# Altium schematic symbol library jlcpcb_2025_04_capacitors_extended_0805.schlib: 3281 symbols (part 7 of 18) (continued)
## CC0805CRNPO9BN3R3
designator C?  Capacitance: 3.3pF  (hidden comment: *)
Capacitor, Ceramic (MLCC), 3.3pF, 50V, NP0, SMD 0805; Manufacturer: YAGEO; Manufacturer Part Number: CC0805CRNPO9BN3R3; Package Size: 0805; JLCPCB Basic Part: No; JLCPCB Part Number: C327234; Supplier 1: LCSC; Category: Capacitors - MLCC; Supplier Part Number 1: C327234; Voltage Rating: 50V; Temperature Coefficient: NP0; RoHS: Yes; ComponentLink1Description: Datasheet; ComponentLink1URL: https://wmsc.lcsc.com/wmsc/upload/file/pdf/v2/lcsc/1811141242_YAGEO-CC0805CRNPO9BN3R3_C327234.pdf; ComponentLink2Description: JLCPCB Part URL; ComponentLink2URL: https://jlcpcb.com/partdetail/C327234; ComponentLink3Description: LCSC Part URL; ComponentLink3URL: https://lcsc.com/product-detail/Multilayer-Ceramic-Capacitors-MLCC---SMD-SMT_YAGEO-YAGEO-CC0805CRNPO9BN3R3_C327234.html
footprint CAP-0805 (0805 (2012M) Capacitor)
pins: 1, 2

## CC0805CRNPO9BN3R6
designator C?  Capacitance: 3.6pF  (hidden comment: *)
Capacitor, Ceramic (MLCC), 3.6pF, 50V, NP0, SMD 0805; Manufacturer: YAGEO; Manufacturer Part Number: CC0805CRNPO9BN3R6; Package Size: 0805; JLCPCB Basic Part: No; JLCPCB Part Number: C519952; Supplier 1: LCSC; Category: Capacitors - MLCC; Supplier Part Number 1: C519952; Voltage Rating: 50V; Temperature Coefficient: NP0; RoHS: Yes; ComponentLink1Description: Datasheet; ComponentLink1URL: https://wmsc.lcsc.com/wmsc/upload/file/pdf/v2/lcsc/2007231534_YAGEO-CC0805CRNPO9BN3R6_C519952.pdf; ComponentLink2Description: JLCPCB Part URL; ComponentLink2URL: https://jlcpcb.com/partdetail/C519952; ComponentLink3Description: LCSC Part URL; ComponentLink3URL: https://lcsc.com/product-detail/Multilayer-Ceramic-Capacitors-MLCC---SMD-SMT_YAGEO-YAGEO-CC0805CRNPO9BN3R6_C519952.html
footprint CAP-0805 (0805 (2012M) Capacitor)
pins: 1, 2

## CC0805CRNPO9BN3R9
designator C?  Capacitance: 3.9pF  (hidden comment: *)
Capacitor, Ceramic (MLCC), 3.9pF, 50V, NP0, SMD 0805; Manufacturer: YAGEO; Manufacturer Part Number: CC0805CRNPO9BN3R9; Package Size: 0805; JLCPCB Basic Part: No; JLCPCB Part Number: C519938; Supplier 1: LCSC; Category: Capacitors - MLCC; Supplier Part Number 1: C519938; Voltage Rating: 50V; Temperature Coefficient: NP0; RoHS: Yes; ComponentLink1Description: Datasheet; ComponentLink1URL: https://wmsc.lcsc.com/wmsc/upload/file/pdf/v2/lcsc/2008031233_YAGEO-CC0805CRNPO9BN3R9_C519938.pdf; ComponentLink2Description: JLCPCB Part URL; ComponentLink2URL: https://jlcpcb.com/partdetail/C519938; ComponentLink3Description: LCSC Part URL; ComponentLink3URL: https://lcsc.com/product-detail/Multilayer-Ceramic-Capacitors-MLCC---SMD-SMT_YAGEO-YAGEO-CC0805CRNPO9BN3R9_C519938.html
footprint CAP-0805 (0805 (2012M) Capacitor)
pins: 1, 2

## CC0805CRNPO9BN4R0
designator C?  Capacitance: 4pF  (hidden comment: *)
Capacitor, Ceramic (MLCC), 4pF, 50V, NP0, SMD 0805; Manufacturer: YAGEO; Manufacturer Part Number: CC0805CRNPO9BN4R0; Package Size: 0805; JLCPCB Basic Part: No; JLCPCB Part Number: C519939; Supplier 1: LCSC; Category: Capacitors - MLCC; Supplier Part Number 1: C519939; Voltage Rating: 50V; Temperature Coefficient: NP0; RoHS: Yes; ComponentLink1Description: Datasheet; ComponentLink1URL: https://wmsc.lcsc.com/wmsc/upload/file/pdf/v2/lcsc/2005141203_YAGEO-CC0805CRNPO9BN4R0_C519939.pdf; ComponentLink2Description: JLCPCB Part URL; ComponentLink2URL: https://jlcpcb.com/partdetail/C519939; ComponentLink3Description: LCSC Part URL; ComponentLink3URL: https://lcsc.com/product-detail/Multilayer-Ceramic-Capacitors-MLCC---SMD-SMT_YAGEO-YAGEO-CC0805CRNPO9BN4R0_C519939.html
footprint CAP-0805 (0805 (2012M) Capacitor)
pins: 1, 2

## CC0805CRNPO9BN4R7
designator C?  Capacitance: 4.7pF  (hidden comment: *)
Capacitor, Ceramic (MLCC), 4.7pF, 50V, NP0, SMD 0805; Manufacturer: YAGEO; Manufacturer Part Number: CC0805CRNPO9BN4R7; Package Size: 0805; JLCPCB Basic Part: No; JLCPCB Part Number: C327159; Supplier 1: LCSC; Category: Capacitors - MLCC; Supplier Part Number 1: C327159; Voltage Rating: 50V; Temperature Coefficient: NP0; RoHS: Yes; ComponentLink1Description: Datasheet; ComponentLink1URL: https://wmsc.lcsc.com/wmsc/upload/file/pdf/v2/lcsc/1811141224_YAGEO-CC0805CRNPO9BN4R7_C327159.pdf; ComponentLink2Description: JLCPCB Part URL; ComponentLink2URL: https://jlcpcb.com/partdetail/C327159; ComponentLink3Description: LCSC Part URL; ComponentLink3URL: https://lcsc.com/product-detail/Multilayer-Ceramic-Capacitors-MLCC---SMD-SMT_YAGEO-YAGEO-CC0805CRNPO9BN4R7_C327159.html
footprint CAP-0805 (0805 (2012M) Capacitor)
pins: 1, 2

## CC0805CRNPO9BN5R0
designator C?  Capacitance: 5pF  (hidden comment: *)
Capacitor, Ceramic (MLCC), 5pF, 50V, NP0, SMD 0805; Manufacturer: YAGEO; Manufacturer Part Number: CC0805CRNPO9BN5R0; Package Size: 0805; JLCPCB Basic Part: No; JLCPCB Part Number: C519940; Supplier 1: LCSC; Category: Capacitors - MLCC; Supplier Part Number 1: C519940; Voltage Rating: 50V; Temperature Coefficient: NP0; RoHS: Yes; ComponentLink1Description: Datasheet; ComponentLink1URL: https://wmsc.lcsc.com/wmsc/upload/file/pdf/v2/lcsc/2007161234_YAGEO-CC0805CRNPO9BN5R0_C519940.pdf; ComponentLink2Description: JLCPCB Part URL; ComponentLink2URL: https://jlcpcb.com/partdetail/C519940; ComponentLink3Description: LCSC Part URL; ComponentLink3URL: https://lcsc.com/product-detail/Multilayer-Ceramic-Capacitors-MLCC---SMD-SMT_YAGEO-YAGEO-CC0805CRNPO9BN5R0_C519940.html
footprint CAP-0805 (0805 (2012M) Capacitor)
pins: 1, 2

## CC0805CRNPO9BN5R1
designator C?  Capacitance: 5.1pF  (hidden comment: *)
Capacitor, Ceramic (MLCC), 5.1pF, 50V, NP0, SMD 0805; Manufacturer: YAGEO; Manufacturer Part Number: CC0805CRNPO9BN5R1; Package Size: 0805; JLCPCB Basic Part: No; JLCPCB Part Number: C519941; Supplier 1: LCSC; Category: Capacitors - MLCC; Supplier Part Number 1: C519941; Voltage Rating: 50V; Temperature Coefficient: NP0; RoHS: Yes; ComponentLink1Description: Datasheet; ComponentLink1URL: https://wmsc.lcsc.com/wmsc/upload/file/pdf/v2/lcsc/2008051835_YAGEO-CC0805CRNPO9BN5R1_C519941.pdf; ComponentLink2Description: JLCPCB Part URL; ComponentLink2URL: https://jlcpcb.com/partdetail/C519941; ComponentLink3Description: LCSC Part URL; ComponentLink3URL: https://lcsc.com/product-detail/Multilayer-Ceramic-Capacitors-MLCC---SMD-SMT_YAGEO-YAGEO-CC0805CRNPO9BN5R1_C519941.html
footprint CAP-0805 (0805 (2012M) Capacitor)
pins: 1, 2

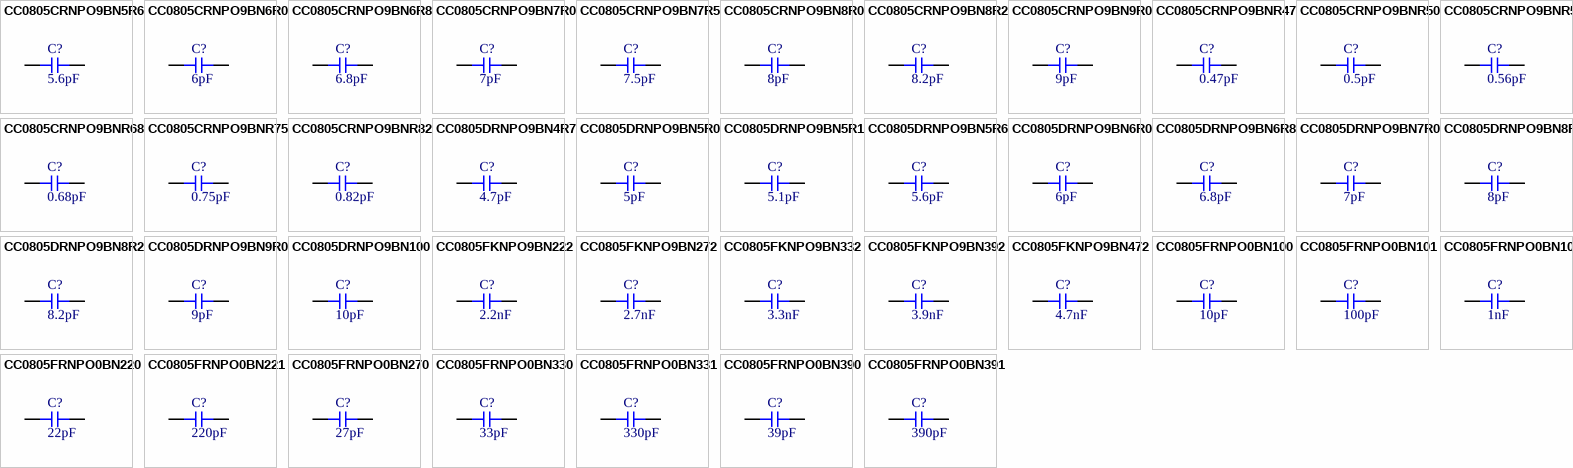
[diagram p31: symbols CC0805CRNPO9BN5R6 to CC0805FRNPO0BN391]

## CC0805CRNPO9BN5R6
designator C?  Capacitance: 5.6pF  (hidden comment: *)
Capacitor, Ceramic (MLCC), 5.6pF, 50V, NP0, SMD 0805; Manufacturer: YAGEO; Manufacturer Part Number: CC0805CRNPO9BN5R6; Package Size: 0805; JLCPCB Basic Part: No; JLCPCB Part Number: C513555; Supplier 1: LCSC; Category: Capacitors - MLCC; Supplier Part Number 1: C513555; Voltage Rating: 50V; Temperature Coefficient: NP0; RoHS: Yes; ComponentLink1Description: Datasheet; ComponentLink1URL: https://wmsc.lcsc.com/wmsc/upload/file/pdf/v2/lcsc/2004231432_YAGEO-CC0805CRNPO9BN5R6_C513555.pdf; ComponentLink2Description: JLCPCB Part URL; ComponentLink2URL: https://jlcpcb.com/partdetail/C513555; ComponentLink3Description: LCSC Part URL; ComponentLink3URL: https://lcsc.com/product-detail/Multilayer-Ceramic-Capacitors-MLCC---SMD-SMT_YAGEO-YAGEO-CC0805CRNPO9BN5R6_C513555.html
footprint CAP-0805 (0805 (2012M) Capacitor)
pins: 1, 2

## CC0805CRNPO9BN6R0
designator C?  Capacitance: 6pF  (hidden comment: *)
Capacitor, Ceramic (MLCC), 6pF, 50V, NP0, SMD 0805; Manufacturer: YAGEO; Manufacturer Part Number: CC0805CRNPO9BN6R0; Package Size: 0805; JLCPCB Basic Part: No; JLCPCB Part Number: C136031; Supplier 1: LCSC; Category: Capacitors - MLCC; Supplier Part Number 1: C136031; Voltage Rating: 50V; Temperature Coefficient: NP0; RoHS: Yes; ComponentLink1Description: Datasheet; ComponentLink1URL: https://wmsc.lcsc.com/wmsc/upload/file/pdf/v2/lcsc/2006151108_YAGEO-CC0805CRNPO9BN6R0_C136031.pdf; ComponentLink2Description: JLCPCB Part URL; ComponentLink2URL: https://jlcpcb.com/partdetail/C136031; ComponentLink3Description: LCSC Part URL; ComponentLink3URL: https://lcsc.com/product-detail/Multilayer-Ceramic-Capacitors-MLCC---SMD-SMT_YAGEO-YAGEO-CC0805CRNPO9BN6R0_C136031.html
footprint CAP-0805 (0805 (2012M) Capacitor)
pins: 1, 2

## CC0805CRNPO9BN6R8
designator C?  Capacitance: 6.8pF  (hidden comment: *)
Capacitor, Ceramic (MLCC), 6.8pF, 50V, NP0, SMD 0805; Manufacturer: YAGEO; Manufacturer Part Number: CC0805CRNPO9BN6R8; Package Size: 0805; JLCPCB Basic Part: No; JLCPCB Part Number: C519942; Supplier 1: LCSC; Category: Capacitors - MLCC; Supplier Part Number 1: C519942; Voltage Rating: 50V; Temperature Coefficient: NP0; RoHS: Yes; ComponentLink1Description: Datasheet; ComponentLink1URL: https://wmsc.lcsc.com/wmsc/upload/file/pdf/v2/lcsc/2007101233_YAGEO-CC0805CRNPO9BN6R8_C519942.pdf; ComponentLink2Description: JLCPCB Part URL; ComponentLink2URL: https://jlcpcb.com/partdetail/C519942; ComponentLink3Description: LCSC Part URL; ComponentLink3URL: https://lcsc.com/product-detail/Multilayer-Ceramic-Capacitors-MLCC---SMD-SMT_YAGEO-YAGEO-CC0805CRNPO9BN6R8_C519942.html
footprint CAP-0805 (0805 (2012M) Capacitor)
pins: 1, 2

## CC0805CRNPO9BN7R0
designator C?  Capacitance: 7pF  (hidden comment: *)
Capacitor, Ceramic (MLCC), 7pF, 50V, NP0, SMD 0805; Manufacturer: YAGEO; Manufacturer Part Number: CC0805CRNPO9BN7R0; Package Size: 0805; JLCPCB Basic Part: No; JLCPCB Part Number: C309481; Supplier 1: LCSC; Category: Capacitors - MLCC; Supplier Part Number 1: C309481; Voltage Rating: 50V; Temperature Coefficient: NP0; RoHS: Yes; ComponentLink1Description: Datasheet; ComponentLink1URL: https://wmsc.lcsc.com/wmsc/upload/file/pdf/v2/lcsc/2304140030_YAGEO-CC0805CRNPO9BN7R0_C309481.pdf; ComponentLink2Description: JLCPCB Part URL; ComponentLink2URL: https://jlcpcb.com/partdetail/C309481; ComponentLink3Description: LCSC Part URL; ComponentLink3URL: https://lcsc.com/product-detail/Multilayer-Ceramic-Capacitors-MLCC---SMD-SMT_YAGEO-YAGEO-CC0805CRNPO9BN7R0_C309481.html
footprint CAP-0805 (0805 (2012M) Capacitor)
pins: 1, 2

## CC0805CRNPO9BN7R5
designator C?  Capacitance: 7.5pF  (hidden comment: *)
Capacitor, Ceramic (MLCC), 7.5pF, 50V, NP0, SMD 0805; Manufacturer: YAGEO; Manufacturer Part Number: CC0805CRNPO9BN7R5; Package Size: 0805; JLCPCB Basic Part: No; JLCPCB Part Number: C519943; Supplier 1: LCSC; Category: Capacitors - MLCC; Supplier Part Number 1: C519943; Voltage Rating: 50V; Temperature Coefficient: NP0; RoHS: Yes; ComponentLink1Description: Datasheet; ComponentLink1URL: https://wmsc.lcsc.com/wmsc/upload/file/pdf/v2/lcsc/2007161234_YAGEO-CC0805CRNPO9BN7R5_C519943.pdf; ComponentLink2Description: JLCPCB Part URL; ComponentLink2URL: https://jlcpcb.com/partdetail/C519943; ComponentLink3Description: LCSC Part URL; ComponentLink3URL: https://lcsc.com/product-detail/Multilayer-Ceramic-Capacitors-MLCC---SMD-SMT_YAGEO-YAGEO-CC0805CRNPO9BN7R5_C519943.html
footprint CAP-0805 (0805 (2012M) Capacitor)
pins: 1, 2

## CC0805CRNPO9BN8R0
designator C?  Capacitance: 8pF  (hidden comment: *)
Capacitor, Ceramic (MLCC), 8pF, 50V, SMD 0805; Manufacturer: YAGEO; Manufacturer Part Number: CC0805CRNPO9BN8R0; Package Size: 0805; JLCPCB Basic Part: No; JLCPCB Part Number: C519944; Supplier 1: LCSC; Category: Capacitors - MLCC; Supplier Part Number 1: C519944; Voltage Rating: 50V; RoHS: Yes; ComponentLink1Description: Datasheet; ComponentLink1URL: https://wmsc.lcsc.com/wmsc/upload/file/pdf/v2/lcsc/2007161234_YAGEO-CC0805CRNPO9BN8R0_C519944.pdf; ComponentLink2Description: JLCPCB Part URL; ComponentLink2URL: https://jlcpcb.com/partdetail/C519944; ComponentLink3Description: LCSC Part URL; ComponentLink3URL: https://lcsc.com/product-detail/Multilayer-Ceramic-Capacitors-MLCC---SMD-SMT_YAGEO-YAGEO-CC0805CRNPO9BN8R0_C519944.html
footprint CAP-0805 (0805 (2012M) Capacitor)
pins: 1, 2

## CC0805CRNPO9BN8R2
designator C?  Capacitance: 8.2pF  (hidden comment: *)
Capacitor, Ceramic (MLCC), 8.2pF, 50V, NP0, SMD 0805; Manufacturer: YAGEO; Manufacturer Part Number: CC0805CRNPO9BN8R2; Package Size: 0805; JLCPCB Basic Part: No; JLCPCB Part Number: C326837; Supplier 1: LCSC; Category: Capacitors - MLCC; Supplier Part Number 1: C326837; Voltage Rating: 50V; Temperature Coefficient: NP0; RoHS: Yes; ComponentLink1Description: Datasheet; ComponentLink1URL: https://wmsc.lcsc.com/wmsc/upload/file/pdf/v2/lcsc/1811141224_YAGEO-CC0805CRNPO9BN8R2_C326837.pdf; ComponentLink2Description: JLCPCB Part URL; ComponentLink2URL: https://jlcpcb.com/partdetail/C326837; ComponentLink3Description: LCSC Part URL; ComponentLink3URL: https://lcsc.com/product-detail/Multilayer-Ceramic-Capacitors-MLCC---SMD-SMT_YAGEO-YAGEO-CC0805CRNPO9BN8R2_C326837.html
footprint CAP-0805 (0805 (2012M) Capacitor)
pins: 1, 2

## CC0805CRNPO9BN9R0
designator C?  Capacitance: 9pF  (hidden comment: *)
Capacitor, Ceramic (MLCC), 9pF, 50V, NP0, SMD 0805; Manufacturer: YAGEO; Manufacturer Part Number: CC0805CRNPO9BN9R0; Package Size: 0805; JLCPCB Basic Part: No; JLCPCB Part Number: C519945; Supplier 1: LCSC; Category: Capacitors - MLCC; Supplier Part Number 1: C519945; Voltage Rating: 50V; Temperature Coefficient: NP0; RoHS: Yes; ComponentLink1Description: Datasheet; ComponentLink1URL: https://wmsc.lcsc.com/wmsc/upload/file/pdf/v2/lcsc/2006011835_YAGEO-CC0805CRNPO9BN9R0_C519945.pdf; ComponentLink2Description: JLCPCB Part URL; ComponentLink2URL: https://jlcpcb.com/partdetail/C519945; ComponentLink3Description: LCSC Part URL; ComponentLink3URL: https://lcsc.com/product-detail/Multilayer-Ceramic-Capacitors-MLCC---SMD-SMT_YAGEO-YAGEO-CC0805CRNPO9BN9R0_C519945.html
footprint CAP-0805 (0805 (2012M) Capacitor)
pins: 1, 2

## CC0805CRNPO9BNR47
designator C?  Capacitance: 0.47pF  (hidden comment: *)
Capacitor, Ceramic (MLCC), 0.47pF, 50V, NP0, SMD 0805; Manufacturer: YAGEO; Manufacturer Part Number: CC0805CRNPO9BNR47; Package Size: 0805; JLCPCB Basic Part: No; JLCPCB Part Number: C519946; Supplier 1: LCSC; Category: Capacitors - MLCC; Supplier Part Number 1: C519946; Voltage Rating: 50V; Temperature Coefficient: NP0; RoHS: Yes; ComponentLink1Description: Datasheet; ComponentLink1URL: https://wmsc.lcsc.com/wmsc/upload/file/pdf/v2/lcsc/2006011835_YAGEO-CC0805CRNPO9BNR47_C519946.pdf; ComponentLink2Description: JLCPCB Part URL; ComponentLink2URL: https://jlcpcb.com/partdetail/C519946; ComponentLink3Description: LCSC Part URL; ComponentLink3URL: https://lcsc.com/product-detail/Multilayer-Ceramic-Capacitors-MLCC---SMD-SMT_YAGEO-YAGEO-CC0805CRNPO9BNR47_C519946.html
footprint CAP-0805 (0805 (2012M) Capacitor)
pins: 1, 2

## CC0805CRNPO9BNR50
designator C?  Capacitance: 0.5pF  (hidden comment: *)
Capacitor, Ceramic (MLCC), 0.5pF, 50V, NP0, SMD 0805; Manufacturer: YAGEO; Manufacturer Part Number: CC0805CRNPO9BNR50; Package Size: 0805; JLCPCB Basic Part: No; JLCPCB Part Number: C519947; Supplier 1: LCSC; Category: Capacitors - MLCC; Supplier Part Number 1: C519947; Voltage Rating: 50V; Temperature Coefficient: NP0; RoHS: Yes; ComponentLink1Description: Datasheet; ComponentLink1URL: https://wmsc.lcsc.com/wmsc/upload/file/pdf/v2/lcsc/2005141203_YAGEO-CC0805CRNPO9BNR50_C519947.pdf; ComponentLink2Description: JLCPCB Part URL; ComponentLink2URL: https://jlcpcb.com/partdetail/C519947; ComponentLink3Description: LCSC Part URL; ComponentLink3URL: https://lcsc.com/product-detail/Multilayer-Ceramic-Capacitors-MLCC---SMD-SMT_YAGEO-YAGEO-CC0805CRNPO9BNR50_C519947.html
footprint CAP-0805 (0805 (2012M) Capacitor)
pins: 1, 2

## CC0805CRNPO9BNR56
designator C?  Capacitance: 0.56pF  (hidden comment: *)
Capacitor, Ceramic (MLCC), 0.56pF, 50V, NP0, SMD 0805; Manufacturer: YAGEO; Manufacturer Part Number: CC0805CRNPO9BNR56; Package Size: 0805; JLCPCB Basic Part: No; JLCPCB Part Number: C519948; Supplier 1: LCSC; Category: Capacitors - MLCC; Supplier Part Number 1: C519948; Voltage Rating: 50V; Temperature Coefficient: NP0; RoHS: Yes; ComponentLink1Description: Datasheet; ComponentLink1URL: https://wmsc.lcsc.com/wmsc/upload/file/pdf/v2/lcsc/2007231534_YAGEO-CC0805CRNPO9BNR56_C519948.pdf; ComponentLink2Description: JLCPCB Part URL; ComponentLink2URL: https://jlcpcb.com/partdetail/C519948; ComponentLink3Description: LCSC Part URL; ComponentLink3URL: https://lcsc.com/product-detail/Multilayer-Ceramic-Capacitors-MLCC---SMD-SMT_YAGEO-YAGEO-CC0805CRNPO9BNR56_C519948.html
footprint CAP-0805 (0805 (2012M) Capacitor)
pins: 1, 2

## CC0805CRNPO9BNR68
designator C?  Capacitance: 0.68pF  (hidden comment: *)
Capacitor, Ceramic (MLCC), 0.68pF, 50V, NP0, SMD 0805; Manufacturer: YAGEO; Manufacturer Part Number: CC0805CRNPO9BNR68; Package Size: 0805; JLCPCB Basic Part: No; JLCPCB Part Number: C519949; Supplier 1: LCSC; Category: Capacitors - MLCC; Supplier Part Number 1: C519949; Voltage Rating: 50V; Temperature Coefficient: NP0; RoHS: Yes; ComponentLink1Description: Datasheet; ComponentLink1URL: https://wmsc.lcsc.com/wmsc/upload/file/pdf/v2/lcsc/2007161234_YAGEO-CC0805CRNPO9BNR68_C519949.pdf; ComponentLink2Description: JLCPCB Part URL; ComponentLink2URL: https://jlcpcb.com/partdetail/C519949; ComponentLink3Description: LCSC Part URL; ComponentLink3URL: https://lcsc.com/product-detail/Multilayer-Ceramic-Capacitors-MLCC---SMD-SMT_YAGEO-YAGEO-CC0805CRNPO9BNR68_C519949.html
footprint CAP-0805 (0805 (2012M) Capacitor)
pins: 1, 2

## CC0805CRNPO9BNR75
designator C?  Capacitance: 0.75pF  (hidden comment: *)
Capacitor, Ceramic (MLCC), 0.75pF, 50V, NP0, SMD 0805; Manufacturer: YAGEO; Manufacturer Part Number: CC0805CRNPO9BNR75; Package Size: 0805; JLCPCB Basic Part: No; JLCPCB Part Number: C519950; Supplier 1: LCSC; Category: Capacitors - MLCC; Supplier Part Number 1: C519950; Voltage Rating: 50V; Temperature Coefficient: NP0; RoHS: Yes; ComponentLink1Description: Datasheet; ComponentLink1URL: https://wmsc.lcsc.com/wmsc/upload/file/pdf/v2/lcsc/2007161234_YAGEO-CC0805CRNPO9BNR75_C519950.pdf; ComponentLink2Description: JLCPCB Part URL; ComponentLink2URL: https://jlcpcb.com/partdetail/C519950; ComponentLink3Description: LCSC Part URL; ComponentLink3URL: https://lcsc.com/product-detail/Multilayer-Ceramic-Capacitors-MLCC---SMD-SMT_YAGEO-YAGEO-CC0805CRNPO9BNR75_C519950.html
footprint CAP-0805 (0805 (2012M) Capacitor)
pins: 1, 2

## CC0805CRNPO9BNR82
designator C?  Capacitance: 0.82pF  (hidden comment: *)
Capacitor, Ceramic (MLCC), 0.82pF, 50V, NP0, SMD 0805; Manufacturer: YAGEO; Manufacturer Part Number: CC0805CRNPO9BNR82; Package Size: 0805; JLCPCB Basic Part: No; JLCPCB Part Number: C519951; Supplier 1: LCSC; Category: Capacitors - MLCC; Supplier Part Number 1: C519951; Voltage Rating: 50V; Temperature Coefficient: NP0; RoHS: Yes; ComponentLink1Description: Datasheet; ComponentLink1URL: https://wmsc.lcsc.com/wmsc/upload/file/pdf/v2/lcsc/2008051835_YAGEO-CC0805CRNPO9BNR82_C519951.pdf; ComponentLink2Description: JLCPCB Part URL; ComponentLink2URL: https://jlcpcb.com/partdetail/C519951; ComponentLink3Description: LCSC Part URL; ComponentLink3URL: https://lcsc.com/product-detail/Multilayer-Ceramic-Capacitors-MLCC---SMD-SMT_YAGEO-YAGEO-CC0805CRNPO9BNR82_C519951.html
footprint CAP-0805 (0805 (2012M) Capacitor)
pins: 1, 2

## CC0805DRNPO9BN4R7
designator C?  Capacitance: 4.7pF  (hidden comment: *)
Capacitor, Ceramic (MLCC), 4.7pF, 50V, NP0, SMD 0805; Manufacturer: YAGEO; Manufacturer Part Number: CC0805DRNPO9BN4R7; Package Size: 0805; JLCPCB Basic Part: No; JLCPCB Part Number: C2181061; Supplier 1: LCSC; Category: Capacitors - MLCC; Supplier Part Number 1: C2181061; Voltage Rating: 50V; Temperature Coefficient: NP0; RoHS: Yes; ComponentLink1Description: Datasheet; ComponentLink1URL: https://wmsc.lcsc.com/wmsc/upload/file/pdf/v2/lcsc/2202041200_YAGEO-CC0805DRNPO9BN4R7_C2181061.pdf; ComponentLink2Description: JLCPCB Part URL; ComponentLink2URL: https://jlcpcb.com/partdetail/C2181061; ComponentLink3Description: LCSC Part URL; ComponentLink3URL: https://lcsc.com/product-detail/Multilayer-Ceramic-Capacitors-MLCC---SMD-SMT_YAGEO-YAGEO-CC0805DRNPO9BN4R7_C2181061.html
footprint CAP-0805 (0805 (2012M) Capacitor)
pins: 1, 2

## CC0805DRNPO9BN5R0
designator C?  Capacitance: 5pF  (hidden comment: *)
Capacitor, Ceramic (MLCC), 5pF, 50V, NP0, SMD 0805; Manufacturer: YAGEO; Manufacturer Part Number: CC0805DRNPO9BN5R0; Package Size: 0805; JLCPCB Basic Part: No; JLCPCB Part Number: C513573; Supplier 1: LCSC; Category: Capacitors - MLCC; Supplier Part Number 1: C513573; Voltage Rating: 50V; Temperature Coefficient: NP0; RoHS: Yes; ComponentLink1Description: Datasheet; ComponentLink1URL: https://wmsc.lcsc.com/wmsc/upload/file/pdf/v2/lcsc/2004231432_YAGEO-CC0805DRNPO9BN5R0_C513573.pdf; ComponentLink2Description: JLCPCB Part URL; ComponentLink2URL: https://jlcpcb.com/partdetail/C513573; ComponentLink3Description: LCSC Part URL; ComponentLink3URL: https://lcsc.com/product-detail/Multilayer-Ceramic-Capacitors-MLCC---SMD-SMT_YAGEO-YAGEO-CC0805DRNPO9BN5R0_C513573.html
footprint CAP-0805 (0805 (2012M) Capacitor)
pins: 1, 2

## CC0805DRNPO9BN5R1
designator C?  Capacitance: 5.1pF  (hidden comment: *)
Capacitor, Ceramic (MLCC), 5.1pF, 50V, NP0, SMD 0805; Manufacturer: YAGEO; Manufacturer Part Number: CC0805DRNPO9BN5R1; Package Size: 0805; JLCPCB Basic Part: No; JLCPCB Part Number: C519955; Supplier 1: LCSC; Category: Capacitors - MLCC; Supplier Part Number 1: C519955; Voltage Rating: 50V; Temperature Coefficient: NP0; RoHS: Yes; ComponentLink1Description: Datasheet; ComponentLink1URL: https://wmsc.lcsc.com/wmsc/upload/file/pdf/v2/lcsc/2008051835_YAGEO-CC0805DRNPO9BN5R1_C519955.pdf; ComponentLink2Description: JLCPCB Part URL; ComponentLink2URL: https://jlcpcb.com/partdetail/C519955; ComponentLink3Description: LCSC Part URL; ComponentLink3URL: https://lcsc.com/product-detail/Multilayer-Ceramic-Capacitors-MLCC---SMD-SMT_YAGEO-YAGEO-CC0805DRNPO9BN5R1_C519955.html
footprint CAP-0805 (0805 (2012M) Capacitor)
pins: 1, 2

## CC0805DRNPO9BN5R6
designator C?  Capacitance: 5.6pF  (hidden comment: *)
Capacitor, Ceramic (MLCC), 5.6pF, 50V, NP0, SMD 0805; Manufacturer: YAGEO; Manufacturer Part Number: CC0805DRNPO9BN5R6; Package Size: 0805; JLCPCB Basic Part: No; JLCPCB Part Number: C519956; Supplier 1: LCSC; Category: Capacitors - MLCC; Supplier Part Number 1: C519956; Voltage Rating: 50V; Temperature Coefficient: NP0; RoHS: Yes; ComponentLink1Description: Datasheet; ComponentLink1URL: https://wmsc.lcsc.com/wmsc/upload/file/pdf/v2/lcsc/2006011835_YAGEO-CC0805DRNPO9BN5R6_C519956.pdf; ComponentLink2Description: JLCPCB Part URL; ComponentLink2URL: https://jlcpcb.com/partdetail/C519956; ComponentLink3Description: LCSC Part URL; ComponentLink3URL: https://lcsc.com/product-detail/Multilayer-Ceramic-Capacitors-MLCC---SMD-SMT_YAGEO-YAGEO-CC0805DRNPO9BN5R6_C519956.html
footprint CAP-0805 (0805 (2012M) Capacitor)
pins: 1, 2

## CC0805DRNPO9BN6R0
designator C?  Capacitance: 6pF  (hidden comment: *)
Capacitor, Ceramic (MLCC), 6pF, 50V, NP0, SMD 0805; Manufacturer: YAGEO; Manufacturer Part Number: CC0805DRNPO9BN6R0; Package Size: 0805; JLCPCB Basic Part: No; JLCPCB Part Number: C519957; Supplier 1: LCSC; Category: Capacitors - MLCC; Supplier Part Number 1: C519957; Voltage Rating: 50V; Temperature Coefficient: NP0; RoHS: Yes; ComponentLink1Description: Datasheet; ComponentLink1URL: https://wmsc.lcsc.com/wmsc/upload/file/pdf/v2/lcsc/2007231534_YAGEO-CC0805DRNPO9BN6R0_C519957.pdf; ComponentLink2Description: JLCPCB Part URL; ComponentLink2URL: https://jlcpcb.com/partdetail/C519957; ComponentLink3Description: LCSC Part URL; ComponentLink3URL: https://lcsc.com/product-detail/Multilayer-Ceramic-Capacitors-MLCC---SMD-SMT_YAGEO-YAGEO-CC0805DRNPO9BN6R0_C519957.html
footprint CAP-0805 (0805 (2012M) Capacitor)
pins: 1, 2

## CC0805DRNPO9BN6R8
designator C?  Capacitance: 6.8pF  (hidden comment: *)
Capacitor, Ceramic (MLCC), 6.8pF, 50V, NP0, SMD 0805; Manufacturer: YAGEO; Manufacturer Part Number: CC0805DRNPO9BN6R8; Package Size: 0805; JLCPCB Basic Part: No; JLCPCB Part Number: C327201; Supplier 1: LCSC; Category: Capacitors - MLCC; Supplier Part Number 1: C327201; Voltage Rating: 50V; Temperature Coefficient: NP0; RoHS: Yes; ComponentLink1Description: Datasheet; ComponentLink1URL: https://wmsc.lcsc.com/wmsc/upload/file/pdf/v2/lcsc/1811141225_YAGEO-CC0805DRNPO9BN6R8_C327201.pdf; ComponentLink2Description: JLCPCB Part URL; ComponentLink2URL: https://jlcpcb.com/partdetail/C327201; ComponentLink3Description: LCSC Part URL; ComponentLink3URL: https://lcsc.com/product-detail/Multilayer-Ceramic-Capacitors-MLCC---SMD-SMT_YAGEO-YAGEO-CC0805DRNPO9BN6R8_C327201.html
footprint CAP-0805 (0805 (2012M) Capacitor)
pins: 1, 2

## CC0805DRNPO9BN7R0
designator C?  Capacitance: 7pF  (hidden comment: *)
Capacitor, Ceramic (MLCC), 7pF, 50V, NP0, SMD 0805; Manufacturer: YAGEO; Manufacturer Part Number: CC0805DRNPO9BN7R0; Package Size: 0805; JLCPCB Basic Part: No; JLCPCB Part Number: C519958; Supplier 1: LCSC; Category: Capacitors - MLCC; Supplier Part Number 1: C519958; Voltage Rating: 50V; Temperature Coefficient: NP0; RoHS: Yes; ComponentLink1Description: Datasheet; ComponentLink1URL: https://wmsc.lcsc.com/wmsc/upload/file/pdf/v2/lcsc/2006011835_YAGEO-CC0805DRNPO9BN7R0_C519958.pdf; ComponentLink2Description: JLCPCB Part URL; ComponentLink2URL: https://jlcpcb.com/partdetail/C519958; ComponentLink3Description: LCSC Part URL; ComponentLink3URL: https://lcsc.com/product-detail/Multilayer-Ceramic-Capacitors-MLCC---SMD-SMT_YAGEO-YAGEO-CC0805DRNPO9BN7R0_C519958.html
footprint CAP-0805 (0805 (2012M) Capacitor)
pins: 1, 2

## CC0805DRNPO9BN8R0
designator C?  Capacitance: 8pF  (hidden comment: *)
Capacitor, Ceramic (MLCC), 8pF, 50V, NP0, SMD 0805; Manufacturer: YAGEO; Manufacturer Part Number: CC0805DRNPO9BN8R0; Package Size: 0805; JLCPCB Basic Part: No; JLCPCB Part Number: C519959; Supplier 1: LCSC; Category: Capacitors - MLCC; Supplier Part Number 1: C519959; Voltage Rating: 50V; Temperature Coefficient: NP0; RoHS: Yes; ComponentLink1Description: Datasheet; ComponentLink1URL: https://wmsc.lcsc.com/wmsc/upload/file/pdf/v2/lcsc/2005181835_YAGEO-CC0805DRNPO9BN8R0_C519959.pdf; ComponentLink2Description: JLCPCB Part URL; ComponentLink2URL: https://jlcpcb.com/partdetail/C519959; ComponentLink3Description: LCSC Part URL; ComponentLink3URL: https://lcsc.com/product-detail/Multilayer-Ceramic-Capacitors-MLCC---SMD-SMT_YAGEO-YAGEO-CC0805DRNPO9BN8R0_C519959.html
footprint CAP-0805 (0805 (2012M) Capacitor)
pins: 1, 2

## CC0805DRNPO9BN8R2
designator C?  Capacitance: 8.2pF  (hidden comment: *)
Capacitor, Ceramic (MLCC), 8.2pF, 50V, NP0, SMD 0805; Manufacturer: YAGEO; Manufacturer Part Number: CC0805DRNPO9BN8R2; Package Size: 0805; JLCPCB Basic Part: No; JLCPCB Part Number: C327233; Supplier 1: LCSC; Category: Capacitors - MLCC; Supplier Part Number 1: C327233; Voltage Rating: 50V; Temperature Coefficient: NP0; RoHS: Yes; ComponentLink1Description: Datasheet; ComponentLink1URL: https://wmsc.lcsc.com/wmsc/upload/file/pdf/v2/lcsc/1811141233_YAGEO-CC0805DRNPO9BN8R2_C327233.pdf; ComponentLink2Description: JLCPCB Part URL; ComponentLink2URL: https://jlcpcb.com/partdetail/C327233; ComponentLink3Description: LCSC Part URL; ComponentLink3URL: https://lcsc.com/product-detail/Multilayer-Ceramic-Capacitors-MLCC---SMD-SMT_YAGEO-YAGEO-CC0805DRNPO9BN8R2_C327233.html
footprint CAP-0805 (0805 (2012M) Capacitor)
pins: 1, 2

## CC0805DRNPO9BN9R0
designator C?  Capacitance: 9pF  (hidden comment: *)
Capacitor, Ceramic (MLCC), 9pF, 50V, NP0, SMD 0805; Manufacturer: YAGEO; Manufacturer Part Number: CC0805DRNPO9BN9R0; Package Size: 0805; JLCPCB Basic Part: No; JLCPCB Part Number: C519960; Supplier 1: LCSC; Category: Capacitors - MLCC; Supplier Part Number 1: C519960; Voltage Rating: 50V; Temperature Coefficient: NP0; RoHS: Yes; ComponentLink1Description: Datasheet; ComponentLink1URL: https://wmsc.lcsc.com/wmsc/upload/file/pdf/v2/lcsc/2007161235_YAGEO-CC0805DRNPO9BN9R0_C519960.pdf; ComponentLink2Description: JLCPCB Part URL; ComponentLink2URL: https://jlcpcb.com/partdetail/C519960; ComponentLink3Description: LCSC Part URL; ComponentLink3URL: https://lcsc.com/product-detail/Multilayer-Ceramic-Capacitors-MLCC---SMD-SMT_YAGEO-YAGEO-CC0805DRNPO9BN9R0_C519960.html
footprint CAP-0805 (0805 (2012M) Capacitor)
pins: 1, 2

## CC0805DRNPO9BN100
designator C?  Capacitance: 10pF  (hidden comment: *)
Capacitor, Ceramic (MLCC), 10pF, 50V, NP0, SMD 0805; Manufacturer: YAGEO; Manufacturer Part Number: CC0805DRNPO9BN100; Package Size: 0805; JLCPCB Basic Part: No; JLCPCB Part Number: C519954; Supplier 1: LCSC; Category: Capacitors - MLCC; Supplier Part Number 1: C519954; Voltage Rating: 50V; Temperature Coefficient: NP0; RoHS: Yes; ComponentLink1Description: Datasheet; ComponentLink1URL: https://wmsc.lcsc.com/wmsc/upload/file/pdf/v2/lcsc/2006011835_YAGEO-CC0805DRNPO9BN100_C519954.pdf; ComponentLink2Description: JLCPCB Part URL; ComponentLink2URL: https://jlcpcb.com/partdetail/C519954; ComponentLink3Description: LCSC Part URL; ComponentLink3URL: https://lcsc.com/product-detail/Multilayer-Ceramic-Capacitors-MLCC---SMD-SMT_YAGEO-YAGEO-CC0805DRNPO9BN100_C519954.html
footprint CAP-0805 (0805 (2012M) Capacitor)
pins: 1, 2

## CC0805FKNPO9BN222
designator C?  Capacitance: 2.2nF  (hidden comment: *)
Capacitor, Ceramic (MLCC), 2.2nF, ±1%, 50V, NP0, ±1%, SMD 0805; Manufacturer: YAGEO; Manufacturer Part Number: CC0805FKNPO9BN222; Package Size: 0805; JLCPCB Basic Part: No; JLCPCB Part Number: C541569; Supplier 1: LCSC; Category: Capacitors - MLCC; Supplier Part Number 1: C541569; Tolerance: ±1%; Voltage Rating: 50V; Temperature Coefficient: NP0; RoHS: Yes; ComponentLink1Description: Datasheet; ComponentLink1URL: https://wmsc.lcsc.com/wmsc/upload/file/pdf/v2/lcsc/2006151213_YAGEO-CC0805FKNPO9BN222_C541569.pdf; ComponentLink2Description: JLCPCB Part URL; ComponentLink2URL: https://jlcpcb.com/partdetail/C541569; ComponentLink3Description: LCSC Part URL; ComponentLink3URL: https://lcsc.com/product-detail/Multilayer-Ceramic-Capacitors-MLCC---SMD-SMT_YAGEO-YAGEO-CC0805FKNPO9BN222_C541569.html
footprint CAP-0805 (0805 (2012M) Capacitor)
pins: 1, 2

## CC0805FKNPO9BN272
designator C?  Capacitance: 2.7nF  (hidden comment: *)
Capacitor, Ceramic (MLCC), 2.7nF, 50V, NP0, SMD 0805; Manufacturer: YAGEO; Manufacturer Part Number: CC0805FKNPO9BN272; Package Size: 0805; JLCPCB Basic Part: No; JLCPCB Part Number: C541570; Supplier 1: LCSC; Category: Capacitors - MLCC; Supplier Part Number 1: C541570; Voltage Rating: 50V; Temperature Coefficient: NP0; RoHS: Yes; ComponentLink1Description: Datasheet; ComponentLink1URL: https://wmsc.lcsc.com/wmsc/upload/file/pdf/v2/lcsc/2006151213_YAGEO-CC0805FKNPO9BN272_C541570.pdf; ComponentLink2Description: JLCPCB Part URL; ComponentLink2URL: https://jlcpcb.com/partdetail/C541570; ComponentLink3Description: LCSC Part URL; ComponentLink3URL: https://lcsc.com/product-detail/Multilayer-Ceramic-Capacitors-MLCC---SMD-SMT_YAGEO-YAGEO-CC0805FKNPO9BN272_C541570.html
footprint CAP-0805 (0805 (2012M) Capacitor)
pins: 1, 2

## CC0805FKNPO9BN332
designator C?  Capacitance: 3.3nF  (hidden comment: *)
Capacitor, Ceramic (MLCC), 3.3nF, 50V, NP0, SMD 0805; Manufacturer: YAGEO; Manufacturer Part Number: CC0805FKNPO9BN332; Package Size: 0805; JLCPCB Basic Part: No; JLCPCB Part Number: C541575; Supplier 1: LCSC; Category: Capacitors - MLCC; Supplier Part Number 1: C541575; Voltage Rating: 50V; Temperature Coefficient: NP0; RoHS: Yes; ComponentLink1Description: Datasheet; ComponentLink1URL: https://wmsc.lcsc.com/wmsc/upload/file/pdf/v2/lcsc/2006151213_YAGEO-CC0805FKNPO9BN332_C541575.pdf; ComponentLink2Description: JLCPCB Part URL; ComponentLink2URL: https://jlcpcb.com/partdetail/C541575; ComponentLink3Description: LCSC Part URL; ComponentLink3URL: https://lcsc.com/product-detail/Multilayer-Ceramic-Capacitors-MLCC---SMD-SMT_YAGEO-YAGEO-CC0805FKNPO9BN332_C541575.html
footprint CAP-0805 (0805 (2012M) Capacitor)
pins: 1, 2

## CC0805FKNPO9BN392
designator C?  Capacitance: 3.9nF  (hidden comment: *)
Capacitor, Ceramic (MLCC), 3.9nF, ±1%, 50V, NP0, ±1%, SMD 0805; Manufacturer: YAGEO; Manufacturer Part Number: CC0805FKNPO9BN392; Package Size: 0805; JLCPCB Basic Part: No; JLCPCB Part Number: C541576; Supplier 1: LCSC; Category: Capacitors - MLCC; Supplier Part Number 1: C541576; Tolerance: ±1%; Voltage Rating: 50V; Temperature Coefficient: NP0; RoHS: Yes; ComponentLink1Description: Datasheet; ComponentLink1URL: https://wmsc.lcsc.com/wmsc/upload/file/pdf/v2/lcsc/2006151213_YAGEO-CC0805FKNPO9BN392_C541576.pdf; ComponentLink2Description: JLCPCB Part URL; ComponentLink2URL: https://jlcpcb.com/partdetail/C541576; ComponentLink3Description: LCSC Part URL; ComponentLink3URL: https://lcsc.com/product-detail/Multilayer-Ceramic-Capacitors-MLCC---SMD-SMT_YAGEO-YAGEO-CC0805FKNPO9BN392_C541576.html
footprint CAP-0805 (0805 (2012M) Capacitor)
pins: 1, 2

## CC0805FKNPO9BN472
designator C?  Capacitance: 4.7nF  (hidden comment: *)
Capacitor, Ceramic (MLCC), 4.7nF, 50V, NP0, SMD 0805; Manufacturer: YAGEO; Manufacturer Part Number: CC0805FKNPO9BN472; Package Size: 0805; JLCPCB Basic Part: No; JLCPCB Part Number: C541577; Supplier 1: LCSC; Category: Capacitors - MLCC; Supplier Part Number 1: C541577; Voltage Rating: 50V; Temperature Coefficient: NP0; RoHS: Yes; ComponentLink1Description: Datasheet; ComponentLink1URL: https://wmsc.lcsc.com/wmsc/upload/file/pdf/v2/lcsc/2006151213_YAGEO-CC0805FKNPO9BN472_C541577.pdf; ComponentLink2Description: JLCPCB Part URL; ComponentLink2URL: https://jlcpcb.com/partdetail/C541577; ComponentLink3Description: LCSC Part URL; ComponentLink3URL: https://lcsc.com/product-detail/Multilayer-Ceramic-Capacitors-MLCC---SMD-SMT_YAGEO-YAGEO-CC0805FKNPO9BN472_C541577.html
footprint CAP-0805 (0805 (2012M) Capacitor)
pins: 1, 2

## CC0805FRNPO0BN100
designator C?  Capacitance: 10pF  (hidden comment: *)
Capacitor, Ceramic (MLCC), 10pF, ±1%, 100V, ±1%, SMD 0805; Manufacturer: YAGEO; Manufacturer Part Number: CC0805FRNPO0BN100; Package Size: 0805; JLCPCB Basic Part: No; JLCPCB Part Number: C576885; Supplier 1: LCSC; Category: Capacitors - MLCC; Supplier Part Number 1: C576885; Tolerance: ±1%; Voltage Rating: 100V; RoHS: Yes; ComponentLink1Description: Datasheet; ComponentLink1URL: https://wmsc.lcsc.com/wmsc/upload/file/pdf/v2/lcsc/2306061129_YAGEO-CC0805FRNPO0BN100_C576885.pdf; ComponentLink2Description: JLCPCB Part URL; ComponentLink2URL: https://jlcpcb.com/partdetail/C576885; ComponentLink3Description: LCSC Part URL; ComponentLink3URL: https://lcsc.com/product-detail/Multilayer-Ceramic-Capacitors-MLCC---SMD-SMT_YAGEO-YAGEO-CC0805FRNPO0BN100_C576885.html
footprint CAP-0805 (0805 (2012M) Capacitor)
pins: 1, 2

## CC0805FRNPO0BN101
designator C?  Capacitance: 100pF  (hidden comment: *)
Capacitor, Ceramic (MLCC), 100pF, ±1%, 100V, NP0, ±1%, SMD 0805; Manufacturer: YAGEO; Manufacturer Part Number: CC0805FRNPO0BN101; Package Size: 0805; JLCPCB Basic Part: No; JLCPCB Part Number: C1853576; Supplier 1: LCSC; Category: Capacitors - MLCC; Supplier Part Number 1: C1853576; Tolerance: ±1%; Voltage Rating: 100V; Temperature Coefficient: NP0; RoHS: Yes; ComponentLink1Description: Datasheet; ComponentLink1URL: https://wmsc.lcsc.com/wmsc/upload/file/pdf/v2/lcsc/2201271100_YAGEO-CC0805FRNPO0BN101_C1853576.pdf; ComponentLink2Description: JLCPCB Part URL; ComponentLink2URL: https://jlcpcb.com/partdetail/C1853576; ComponentLink3Description: LCSC Part URL; ComponentLink3URL: https://lcsc.com/product-detail/Multilayer-Ceramic-Capacitors-MLCC---SMD-SMT_YAGEO-YAGEO-CC0805FRNPO0BN101_C1853576.html
footprint CAP-0805 (0805 (2012M) Capacitor)
pins: 1, 2

## CC0805FRNPO0BN102
designator C?  Capacitance: 1nF  (hidden comment: *)
Capacitor, Ceramic (MLCC), 1nF, ±1%, 100V, NP0, ±1%, SMD 0805; Manufacturer: YAGEO; Manufacturer Part Number: CC0805FRNPO0BN102; Package Size: 0805; JLCPCB Basic Part: No; JLCPCB Part Number: C576886; Supplier 1: LCSC; Category: Capacitors - MLCC; Supplier Part Number 1: C576886; Tolerance: ±1%; Voltage Rating: 100V; Temperature Coefficient: NP0; RoHS: Yes; ComponentLink1Description: Datasheet; ComponentLink1URL: https://wmsc.lcsc.com/wmsc/upload/file/pdf/v2/lcsc/2304140030_YAGEO-CC0805FRNPO0BN102_C576886.pdf; ComponentLink2Description: JLCPCB Part URL; ComponentLink2URL: https://jlcpcb.com/partdetail/C576886; ComponentLink3Description: LCSC Part URL; ComponentLink3URL: https://lcsc.com/product-detail/Multilayer-Ceramic-Capacitors-MLCC---SMD-SMT_YAGEO-YAGEO-CC0805FRNPO0BN102_C576886.html
footprint CAP-0805 (0805 (2012M) Capacitor)
pins: 1, 2

## CC0805FRNPO0BN220
designator C?  Capacitance: 22pF  (hidden comment: *)
Capacitor, Ceramic (MLCC), 22pF, ±1%, 100V, NP0, ±1%, SMD 0805; Manufacturer: YAGEO; Manufacturer Part Number: CC0805FRNPO0BN220; Package Size: 0805; JLCPCB Basic Part: No; JLCPCB Part Number: C576893; Supplier 1: LCSC; Category: Capacitors - MLCC; Supplier Part Number 1: C576893; Tolerance: ±1%; Voltage Rating: 100V; Temperature Coefficient: NP0; RoHS: Yes; ComponentLink1Description: Datasheet; ComponentLink1URL: https://wmsc.lcsc.com/wmsc/upload/file/pdf/v2/lcsc/2311211121_YAGEO-CC0805FRNPO0BN220_C576893.pdf; ComponentLink2Description: JLCPCB Part URL; ComponentLink2URL: https://jlcpcb.com/partdetail/C576893; ComponentLink3Description: LCSC Part URL; ComponentLink3URL: https://lcsc.com/product-detail/Multilayer-Ceramic-Capacitors-MLCC---SMD-SMT_YAGEO-YAGEO-CC0805FRNPO0BN220_C576893.html
footprint CAP-0805 (0805 (2012M) Capacitor)
pins: 1, 2

## CC0805FRNPO0BN221
designator C?  Capacitance: 220pF  (hidden comment: *)
Capacitor, Ceramic (MLCC), 220pF, ±1%, 100V, NP0, ±1%, SMD 0805; Manufacturer: YAGEO; Manufacturer Part Number: CC0805FRNPO0BN221; Package Size: 0805; JLCPCB Basic Part: No; JLCPCB Part Number: C576894; Supplier 1: LCSC; Category: Capacitors - MLCC; Supplier Part Number 1: C576894; Tolerance: ±1%; Voltage Rating: 100V; Temperature Coefficient: NP0; RoHS: Yes; ComponentLink1Description: Datasheet; ComponentLink1URL: https://wmsc.lcsc.com/wmsc/upload/file/pdf/v2/lcsc/2212091030_YAGEO-CC0805FRNPO0BN221_C576894.pdf; ComponentLink2Description: JLCPCB Part URL; ComponentLink2URL: https://jlcpcb.com/partdetail/C576894; ComponentLink3Description: LCSC Part URL; ComponentLink3URL: https://lcsc.com/product-detail/Multilayer-Ceramic-Capacitors-MLCC---SMD-SMT_YAGEO-YAGEO-CC0805FRNPO0BN221_C576894.html
footprint CAP-0805 (0805 (2012M) Capacitor)
pins: 1, 2

## CC0805FRNPO0BN270
designator C?  Capacitance: 27pF  (hidden comment: *)
Capacitor, Ceramic (MLCC), 27pF, ±1%, 100V, NP0, ±1%, SMD 0805; Manufacturer: YAGEO; Manufacturer Part Number: CC0805FRNPO0BN270; Package Size: 0805; JLCPCB Basic Part: No; JLCPCB Part Number: C576895; Supplier 1: LCSC; Category: Capacitors - MLCC; Supplier Part Number 1: C576895; Tolerance: ±1%; Voltage Rating: 100V; Temperature Coefficient: NP0; RoHS: Yes; ComponentLink1Description: Datasheet; ComponentLink1URL: https://wmsc.lcsc.com/wmsc/upload/file/pdf/v2/lcsc/2212091030_YAGEO-CC0805FRNPO0BN270_C576895.pdf; ComponentLink2Description: JLCPCB Part URL; ComponentLink2URL: https://jlcpcb.com/partdetail/C576895; ComponentLink3Description: LCSC Part URL; ComponentLink3URL: https://lcsc.com/product-detail/Multilayer-Ceramic-Capacitors-MLCC---SMD-SMT_YAGEO-YAGEO-CC0805FRNPO0BN270_C576895.html
footprint CAP-0805 (0805 (2012M) Capacitor)
pins: 1, 2

## CC0805FRNPO0BN330
designator C?  Capacitance: 33pF  (hidden comment: *)
Capacitor, Ceramic (MLCC), 33pF, ±1%, 100V, NP0, ±1%, SMD 0805; Manufacturer: YAGEO; Manufacturer Part Number: CC0805FRNPO0BN330; Package Size: 0805; JLCPCB Basic Part: No; JLCPCB Part Number: C576896; Supplier 1: LCSC; Category: Capacitors - MLCC; Supplier Part Number 1: C576896; Tolerance: ±1%; Voltage Rating: 100V; Temperature Coefficient: NP0; RoHS: Yes; ComponentLink1Description: Datasheet; ComponentLink1URL: https://wmsc.lcsc.com/wmsc/upload/file/pdf/v2/lcsc/2212091030_YAGEO-CC0805FRNPO0BN330_C576896.pdf; ComponentLink2Description: JLCPCB Part URL; ComponentLink2URL: https://jlcpcb.com/partdetail/C576896; ComponentLink3Description: LCSC Part URL; ComponentLink3URL: https://lcsc.com/product-detail/Multilayer-Ceramic-Capacitors-MLCC---SMD-SMT_YAGEO-YAGEO-CC0805FRNPO0BN330_C576896.html
footprint CAP-0805 (0805 (2012M) Capacitor)
pins: 1, 2

## CC0805FRNPO0BN331
designator C?  Capacitance: 330pF  (hidden comment: *)
Capacitor, Ceramic (MLCC), 330pF, ±1%, 100V, NP0, ±1%, SMD 0805; Manufacturer: YAGEO; Manufacturer Part Number: CC0805FRNPO0BN331; Package Size: 0805; JLCPCB Basic Part: No; JLCPCB Part Number: C527075; Supplier 1: LCSC; Category: Capacitors - MLCC; Supplier Part Number 1: C527075; Tolerance: ±1%; Voltage Rating: 100V; Temperature Coefficient: NP0; RoHS: Yes; ComponentLink1Description: Datasheet; ComponentLink1URL: https://wmsc.lcsc.com/wmsc/upload/file/pdf/v2/lcsc/2005261832_YAGEO-CC0805FRNPO0BN331_C527075.pdf; ComponentLink2Description: JLCPCB Part URL; ComponentLink2URL: https://jlcpcb.com/partdetail/C527075; ComponentLink3Description: LCSC Part URL; ComponentLink3URL: https://lcsc.com/product-detail/Multilayer-Ceramic-Capacitors-MLCC---SMD-SMT_YAGEO-YAGEO-CC0805FRNPO0BN331_C527075.html
footprint CAP-0805 (0805 (2012M) Capacitor)
pins: 1, 2

## CC0805FRNPO0BN390
designator C?  Capacitance: 39pF  (hidden comment: *)
Capacitor, Ceramic (MLCC), 39pF, ±1%, 100V, NP0, ±1%, SMD 0805; Manufacturer: YAGEO; Manufacturer Part Number: CC0805FRNPO0BN390; Package Size: 0805; JLCPCB Basic Part: No; JLCPCB Part Number: C576897; Supplier 1: LCSC; Category: Capacitors - MLCC; Supplier Part Number 1: C576897; Tolerance: ±1%; Voltage Rating: 100V; Temperature Coefficient: NP0; RoHS: Yes; ComponentLink1Description: Datasheet; ComponentLink1URL: https://wmsc.lcsc.com/wmsc/upload/file/pdf/v2/lcsc/2212091030_YAGEO-CC0805FRNPO0BN390_C576897.pdf; ComponentLink2Description: JLCPCB Part URL; ComponentLink2URL: https://jlcpcb.com/partdetail/C576897; ComponentLink3Description: LCSC Part URL; ComponentLink3URL: https://lcsc.com/product-detail/Multilayer-Ceramic-Capacitors-MLCC---SMD-SMT_YAGEO-YAGEO-CC0805FRNPO0BN390_C576897.html
footprint CAP-0805 (0805 (2012M) Capacitor)
pins: 1, 2

## CC0805FRNPO0BN391
designator C?  Capacitance: 390pF  (hidden comment: *)
Capacitor, Ceramic (MLCC), 390pF, ±1%, 100V, NP0, ±1%, SMD 0805; Manufacturer: YAGEO; Manufacturer Part Number: CC0805FRNPO0BN391; Package Size: 0805; JLCPCB Basic Part: No; JLCPCB Part Number: C576898; Supplier 1: LCSC; Category: Capacitors - MLCC; Supplier Part Number 1: C576898; Tolerance: ±1%; Voltage Rating: 100V; Temperature Coefficient: NP0; RoHS: Yes; ComponentLink1Description: Datasheet; ComponentLink1URL: https://wmsc.lcsc.com/wmsc/upload/file/pdf/v2/lcsc/2211161830_YAGEO-CC0805FRNPO0BN391_C576898.pdf; ComponentLink2Description: JLCPCB Part URL; ComponentLink2URL: https://jlcpcb.com/partdetail/C576898; ComponentLink3Description: LCSC Part URL; ComponentLink3URL: https://lcsc.com/product-detail/Multilayer-Ceramic-Capacitors-MLCC---SMD-SMT_YAGEO-YAGEO-CC0805FRNPO0BN391_C576898.html
footprint CAP-0805 (0805 (2012M) Capacitor)
pins: 1, 2

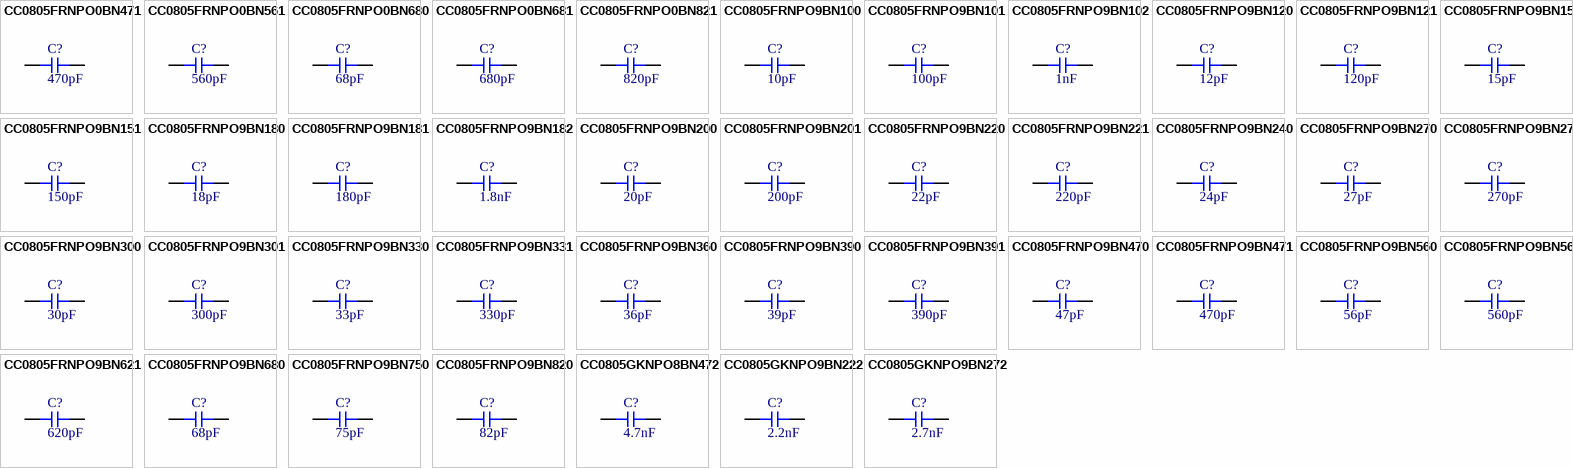
[diagram p32: symbols CC0805FRNPO0BN471 to CC0805GKNPO9BN272]

## CC0805FRNPO0BN471
designator C?  Capacitance: 470pF  (hidden comment: *)
Capacitor, Ceramic (MLCC), 470pF, ±1%, 100V, NP0, ±1%, SMD 0805; Manufacturer: YAGEO; Manufacturer Part Number: CC0805FRNPO0BN471; Package Size: 0805; JLCPCB Basic Part: No; JLCPCB Part Number: C576900; Supplier 1: LCSC; Category: Capacitors - MLCC; Supplier Part Number 1: C576900; Tolerance: ±1%; Voltage Rating: 100V; Temperature Coefficient: NP0; RoHS: Yes; ComponentLink1Description: Datasheet; ComponentLink1URL: https://wmsc.lcsc.com/wmsc/upload/file/pdf/v2/lcsc/2212091030_YAGEO-CC0805FRNPO0BN471_C576900.pdf; ComponentLink2Description: JLCPCB Part URL; ComponentLink2URL: https://jlcpcb.com/partdetail/C576900; ComponentLink3Description: LCSC Part URL; ComponentLink3URL: https://lcsc.com/product-detail/Multilayer-Ceramic-Capacitors-MLCC---SMD-SMT_YAGEO-YAGEO-CC0805FRNPO0BN471_C576900.html
footprint CAP-0805 (0805 (2012M) Capacitor)
pins: 1, 2

## CC0805FRNPO0BN561
designator C?  Capacitance: 560pF  (hidden comment: *)
Capacitor, Ceramic (MLCC), 560pF, ±1%, 100V, NP0, ±1%, SMD 0805; Manufacturer: YAGEO; Manufacturer Part Number: CC0805FRNPO0BN561; Package Size: 0805; JLCPCB Basic Part: No; JLCPCB Part Number: C576903; Supplier 1: LCSC; Category: Capacitors - MLCC; Supplier Part Number 1: C576903; Tolerance: ±1%; Voltage Rating: 100V; Temperature Coefficient: NP0; RoHS: Yes; ComponentLink1Description: Datasheet; ComponentLink1URL: https://wmsc.lcsc.com/wmsc/upload/file/pdf/v2/lcsc/2212222108_YAGEO-CC0805FRNPO0BN561_C576903.pdf; ComponentLink2Description: JLCPCB Part URL; ComponentLink2URL: https://jlcpcb.com/partdetail/C576903; ComponentLink3Description: LCSC Part URL; ComponentLink3URL: https://lcsc.com/product-detail/Multilayer-Ceramic-Capacitors-MLCC---SMD-SMT_YAGEO-YAGEO-CC0805FRNPO0BN561_C576903.html
footprint CAP-0805 (0805 (2012M) Capacitor)
pins: 1, 2